# Altium footprint library PCB SMD.PcbLib: 79 footprints (part 5 of 5)
Each footprint in its own frame and in the unit in brackets; x right, y up, seen from the top. Pads: shape width x height; smd on the part's side, far side on the other; paste and mask are expansions set on the pad; w line width, h text height; cw(c..) or ccw(c..) is an arc to the next point about the centre after c.
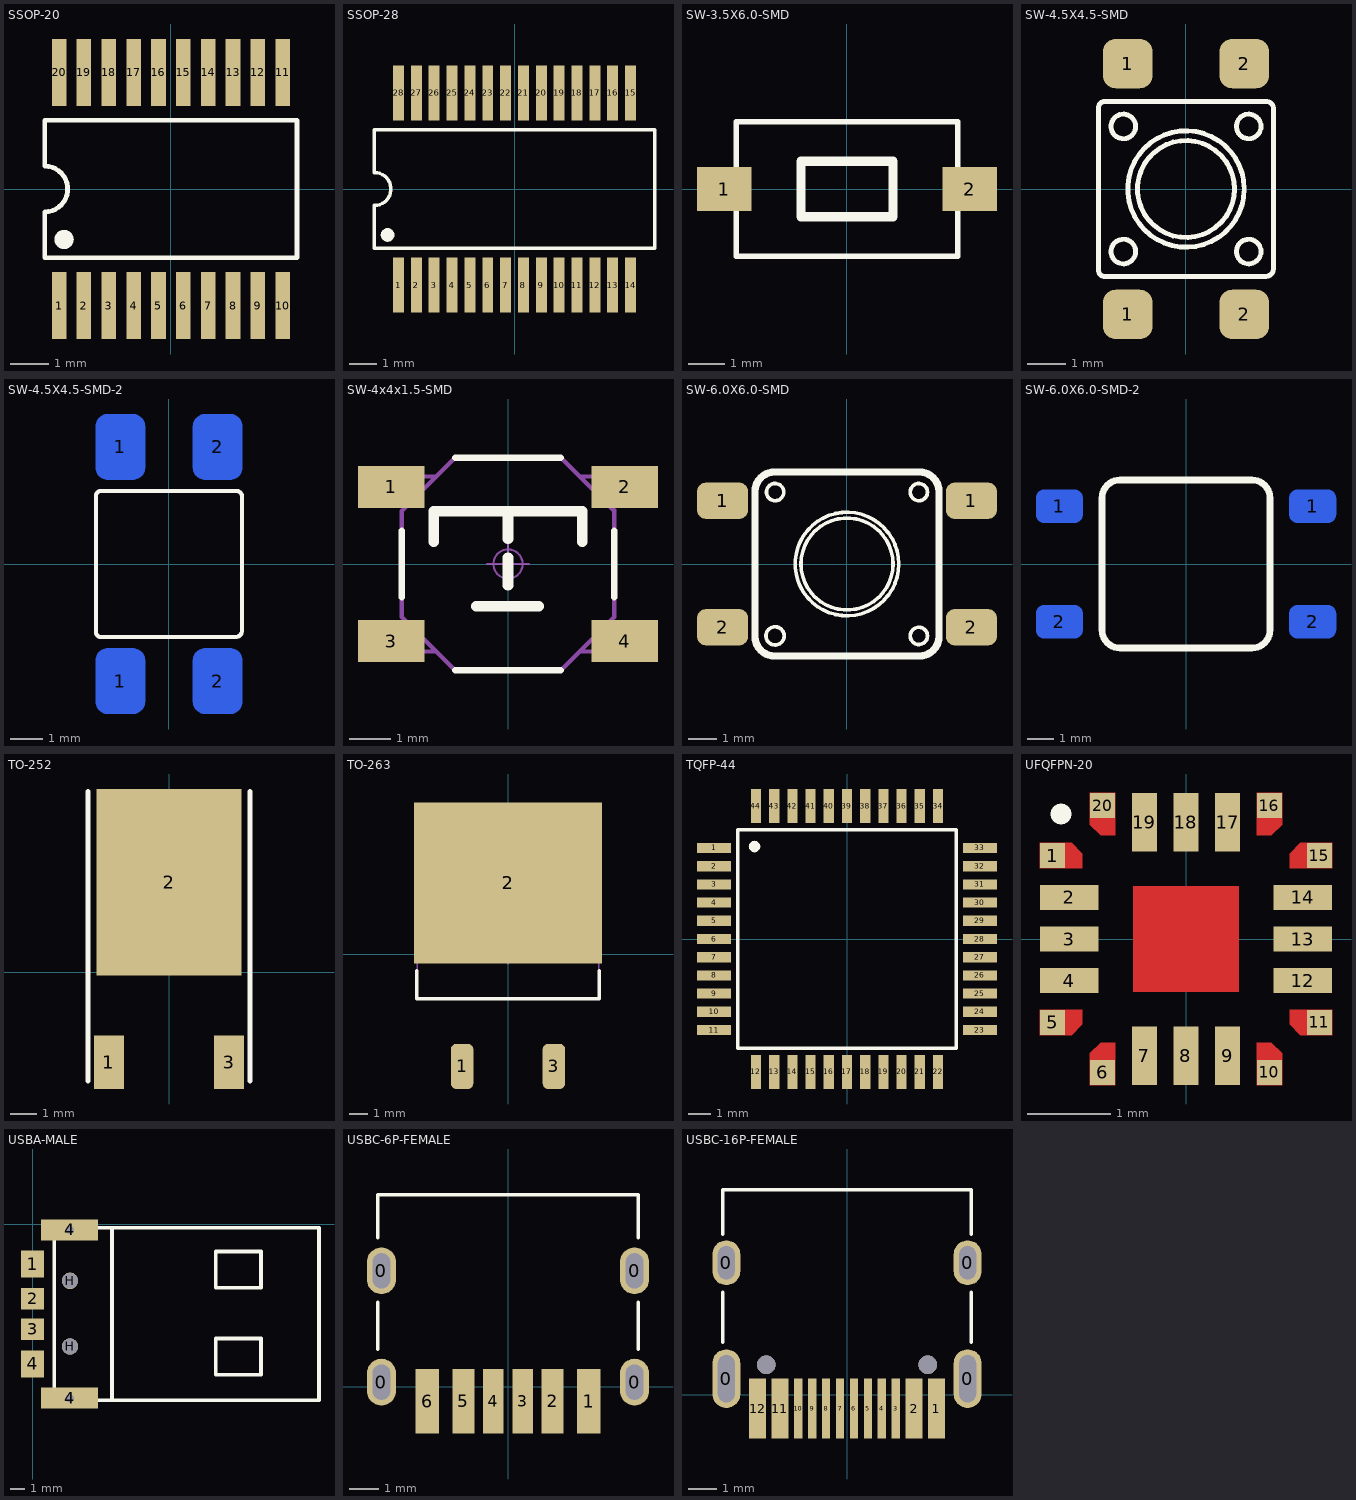
[diagram p4: the footprints below, top view; thin cyan lines are the x and y axes]

## SSOP-20 [mm]
pads (21):
  rect 0.381x1.75 smd: 1(-2.925,-3.05) 2(-2.275,-3.05) 3(-1.625,-3.05) 4(-0.975,-3.05) 5(-0.325,-3.05) 6(0.325,-3.05) 7(0.975,-3.05) 8(1.625,-3.05) 9(2.275,-3.05) 10(2.925,-3.05) 11(2.925,3.05) 12(2.275,3.05) 13(1.625,3.05) 14(0.975,3.05) 15(0.325,3.05) 16(-0.325,3.05) 17(-0.975,3.05) 18(-1.625,3.05) 19(-2.275,3.05) 20(-2.925,3.05)
  round 0.508 on Top Overlay: ""(-2.796,-1.321)
Top Overlay:
  lines w0.127: -3.3,-1.8 -3.3,-0.6 ccw(c-3.3,0) -3.3,0.6 -3.3,1.8 3.3,1.8 3.3,-1.8 -3.3,-1.8
3D body "SW3dPS-SSOP_20.STEP": height 1.79, standoff -0.05, extent -3.675,-3.95 3.625,3.95

## SSOP-28 [mm]
pads (29):
  rect 0.4x2 smd: 1(-4.225,-3.5) 2(-3.575,-3.5) 3(-2.925,-3.5) 4(-2.275,-3.5) 5(-1.625,-3.5) 6(-0.975,-3.5) 7(-0.325,-3.5) 8(0.325,-3.5) 9(0.975,-3.5) 10(1.625,-3.5) 11(2.275,-3.5) 12(2.925,-3.5) 13(3.575,-3.5) 14(4.225,-3.5) 15(4.225,3.5) 16(3.575,3.5) 17(2.925,3.5) 18(2.275,3.5) 19(1.625,3.5) 20(0.975,3.5) 21(0.325,3.5) 22(-0.325,3.5) 23(-0.975,3.5) 24(-1.625,3.5) 25(-2.275,3.5) 26(-2.925,3.5) 27(-3.575,3.5) 28(-4.225,3.5)
  round 0.508 on Top Overlay: ""(-4.622,-1.671)
Top Overlay:
  lines w0.127: -5.1,-2.159 -5.1,-0.6 ccw(c-5.1,0) -5.1,0.6 -5.1,2.159 5.1,2.159 5.1,-2.159 -5.1,-2.159
3D body "User Library-SSOP-28-1-1.STEP": height 2.15, standoff 0, extent -5.165,-3.929 5.165,3.827

## SW-3.5X6.0-SMD [mm]
pads (2):
  rect 1.5x1.2 smd: 1(-3.382,0) 2(3.382,0)
Top Overlay:
  lines w0.152: -3.05,-1.85 -3.05,1.85 3.05,1.85 3.05,-1.85 -3.05,-1.85
  lines w0.254: -1.27,-0.762 -1.27,0.762 1.27,0.762 1.27,-0.762 -1.27,-0.762
3D body "User Library-SWT-39.STEP": height 2.5, standoff 0, extent -4,-1.829 4,1.871

## SW-4.5X4.5-SMD [mm]
pads (4):
  rrect50% 1.27x1.27 smd: 1(-1.5,-3.229) 1(-1.5,3.229) 2(1.5,-3.229) 2(1.5,3.229)
Top Overlay:
  circle w0.127: c-1.615,-1.611 r0.316
  circle w0.127: c-1.615,1.611 r0.316
  circle w0.127: c1.615,-1.611 r0.316
  circle w0.127: c1.615,1.611 r0.316
  circle w0.127: c0,0 r1.25
  circle w0.127: c0,0 r1.5
  lines w0.127: -2.25,-2.108 ccw(c-2.108,-2.108) -2.108,-2.25 2.06,-2.25 ccw(c2.06,-2.06) 2.25,-2.06 2.25,2.083 ccw(c2.083,2.083) 2.083,2.25 -2.108,2.25 ccw(c-2.108,2.108) -2.25,2.108 -2.25,-2.108
3D body "SW4.5x4.5x5.STEP": height -0.39, standoff -5.49, extent -2.25,-3.4 2.25,3.4

## SW-4.5X4.5-SMD-2 [mil]
pads (4):
  rrect50% 60x80 smd far side: 1(-59.05,-142.12) 1(-59.05,142.12) 2(59.06,-142.12) 2(59.06,142.12)
Top Overlay:
  lines w5: -88.58,-83 ccw(c-83,-83) -83,-88.58 81.11,-88.58 ccw(c81.11,-81.1) 88.58,-81.1 88.58,82 ccw(c82,82) 82,88.59 -83,88.59 ccw(c-83,83) -88.58,83 -88.58,-83
3D body "SW4.5x4.5x5.STEP": height 7.87, standoff -192.91, extent -88.58,-133.86 88.58,133.86

## SW-4x4x1.5-SMD [mm]
height 1.5
pads (4):
  rect 1.6x1 smd: 1(-2.8,1.85) 2(2.8,1.85) 3(-2.8,-1.85) 4(2.8,-1.85)
Top Overlay:
  lines w0.152: -2.55,-0.8 -2.55,0.8 ; -1.27,-2.55 1.27,-2.55 ; -1.27,2.55 1.27,2.55 ; 2.55,-0.8 2.55,0.8
  lines w0.254: -1.778,0.533 -1.778,1.27 1.778,1.27 1.778,0.533 ; -0.762,-1.016 0.737,-1.016 ; 0,-0.508 0,0.152 ; 0,0.61 0,1.27
Mechanical 15:
  circle w0.05: c0,0 r0.35
  lines w0.05: -0.5,0 0.5,0 ; 0,-0.5 0,0.5
  lines w0.1: -2.221,-1.6 -3.2,-1.6 -3.2,-2.1 -1.719,-2.1 ; -2.221,1.6 -3.2,1.6 -3.2,2.1 -1.719,2.1 ; 1.719,-2.1 3.2,-2.1 3.2,-1.6 2.221,-1.6 ; 1.719,2.1 3.2,2.1 3.2,1.6 2.221,1.6 ; 2.55,1.27 1.27,2.55 -1.27,2.55 -2.55,1.27 -2.55,-1.27 -1.27,-2.55 1.27,-2.55 2.55,-1.27 2.55,1.295
3D body "ts44h.stp": height 1.5, standoff 0, extent -3.204,-2.6 3.196,2.6

## SW-6.0X6.0-SMD [mm]
pads (4):
  rrect50% 1.778x1.27 smd: 1(-4.327,2.2) 1(4.327,2.2) 2(-4.327,-2.2) 2(4.327,-2.2)
Top Overlay:
  circle w0.127: c-2.5,2.5 r0.3
  circle w0.127: c2.5,2.5 r0.3
  circle w0.127: c2.5,-2.5 r0.3
  circle w0.127: c-2.5,-2.5 r0.316
  circle w0.127: c0,0 r1.8
  circle w0.127: c0,0 r1.6
  lines w0.254: -3.2,-2.517 ccw(c-2.517,-2.517) -2.517,-3.2 2.517,-3.2 ccw(c2.517,-2.517) 3.2,-2.517 3.2,2.517 ccw(c2.517,2.517) 2.517,3.2 -2.517,3.2 ccw(c-2.517,2.517) -3.2,2.517 -3.2,-2.517
3D body "SW3dPS-switch.STEP": height 5, standoff 0, extent -4.5,-3 4.5,3

## SW-6.0X6.0-SMD-2 [mm]
pads (4):
  rrect50% 1.778x1.27 smd far side: 1(-4.827,2.2) 1(4.827,2.2) 2(-4.827,-2.2) 2(4.827,-2.2)
Top Overlay:
  lines w0.254: -3.2,-2.517 ccw(c-2.517,-2.517) -2.517,-3.2 2.517,-3.2 ccw(c2.517,-2.517) 3.2,-2.517 3.2,2.517 ccw(c2.517,2.517) 2.517,3.2 -2.517,3.2 ccw(c-2.517,2.517) -3.2,2.517 -3.2,-2.517
3D body "SW3dPS-switch.STEP": height 4.31, standoff -0.69, extent -4.5,-3 4.5,3

## TO-252 [mm]
pads (3):
  rect 1.143x2.032 smd: 1(-2.285,-3.425) 3(2.285,-3.425)
  rect 5.5x7.1 smd: 2(0,3.425)
Top Overlay:
  lines w0.203: -3.085,-4.125 -3.085,6.875 ; 3.085,-4.125 3.085,6.875
3D body "SW3dPS-DPAK-1.STEP": height 2.41, standoff 0, extent -3.27,-3.699 3.27,6.239

## TO-263 [mm]
pads (3):
  rrect50% 1.25x2.5 smd: 1(-2.54,-6.2) 3(2.54,-6.2)
  rect 10.4x8.9 smd: 2(0,3.95)
Top Overlay:
  lines w0.2: -5.05,-0.9 -5.05,-2.45 5.05,-2.45 5.05,-0.9
Mechanical 13:
  lines w0.1: -5.025,-2.45 5.025,-2.45 5.025,6.53 -5.025,6.53 -5.025,-2.45
Mechanical 15:
  lines w0.1: -0.5,0 0.5,0 ; 0,-0.5 0,0.5
3D body "SW3dPS-DPAK.STEP": height 4.92, standoff -0.09, extent -5.207,-7.454 4.953,7.81

## TQFP-44 [mm]
pads (45):
  rect 1.5x0.45 smd: 1(-5.842,4) 2(-5.842,3.2) 3(-5.842,2.4) 4(-5.842,1.6) 5(-5.842,0.8) 6(-5.842,0) 7(-5.842,-0.8) 8(-5.842,-1.6) 9(-5.842,-2.4) 10(-5.842,-3.2) 11(-5.842,-4) 23(5.842,-4) 24(5.842,-3.2) 25(5.842,-2.4) 26(5.842,-1.6) 27(5.842,-0.8) 28(5.842,0) 29(5.842,0.8) 30(5.842,1.6) 31(5.842,2.4) 32(5.842,3.2) 33(5.842,4)
  rect 0.45x1.5 smd: 12(-4,-5.842) 13(-3.2,-5.842) 14(-2.4,-5.842) 15(-1.6,-5.842) 16(-0.8,-5.842) 17(0,-5.842) 18(0.8,-5.842) 19(1.6,-5.842) 20(2.4,-5.842) 21(3.2,-5.842) 22(4,-5.842) 34(4,5.842) 35(3.2,5.842) 36(2.4,5.842) 37(1.6,5.842) 38(0.8,5.842) 39(0,5.842) 40(-0.8,5.842) 41(-1.6,5.842) 42(-2.4,5.842) 43(-3.2,5.842) 44(-4,5.842)
  round 0.508 on Top Overlay: ""(-4.064,4.064)
Top Overlay:
  lines w0.152: -4.801,-4.801 4.801,-4.801 4.801,4.801 -4.801,4.801 -4.801,-4.801
3D body "User Library-TQFP-44-1.STEP": height 1.1, standoff 0, extent -6,-6 6,6

## UFQFPN-20 [mm]
pads (21):
  rect 0.3x0.3 smd mask+0.05: 1(-1.6,1) 5(-1.6,-1) 6(-1,-1.6) 10(1,-1.6) 11(1.6,-1) 15(1.6,1) 16(1,1.6) 20(-1,1.6)
  rect 0.7x0.3 smd mask+0.05: 2(-1.4,0.5) 3(-1.4,0) 4(-1.4,-0.5) 12(1.4,-0.5) 13(1.4,0) 14(1.4,0.5)
  rect 0.3x0.7 smd mask+0.05: 7(-0.5,-1.4) 8(0,-1.4) 9(0.5,-1.4) 17(0.5,1.4) 18(0,1.4) 19(-0.5,1.4)
  round 0.254 on Top Overlay: ""(-1.5,1.5)
Top Layer:
  region: 1.152,1.373 1.025,1.246 0.848,1.246 0.848,1.754 1.152,1.754
  region: -1.152,-1.373 -1.025,-1.246 -0.848,-1.246 -0.848,-1.754 -1.152,-1.754
  region: 1.152,-1.373 1.025,-1.246 0.848,-1.246 0.848,-1.754 1.152,-1.754
  region: -1.373,-1.152 -1.246,-1.025 -1.246,-0.848 -1.754,-0.848 -1.754,-1.152
  region: -1.373,1.152 -1.246,1.025 -1.246,0.848 -1.754,0.848 -1.754,1.152
  region: -1.152,1.373 -1.025,1.246 -0.848,1.246 -0.848,1.754 -1.152,1.754
  region: 1.373,1.152 1.246,1.025 1.246,0.848 1.754,0.848 1.754,1.152
  region: 1.373,-1.152 1.246,-1.025 1.246,-0.848 1.754,-0.848 1.754,-1.152
  region: -0.635,0.635 0.635,0.635 0.635,-0.635 -0.635,-0.635
Top Solder:
  region: 1.198,1.343 1.046,1.19 0.801,1.19 0.801,1.8 1.198,1.8
  region: -1.198,-1.343 -1.046,-1.19 -0.801,-1.19 -0.801,-1.8 -1.198,-1.8
  region: 1.198,-1.343 1.046,-1.19 0.801,-1.19 0.801,-1.8 1.198,-1.8
  region: -1.343,-1.198 -1.19,-1.046 -1.19,-0.801 -1.8,-0.801 -1.8,-1.198
  region: -1.343,1.198 -1.19,1.046 -1.19,0.801 -1.8,0.801 -1.8,1.198
  region: -1.198,1.343 -1.046,1.19 -0.801,1.19 -0.801,1.8 -1.198,1.8
  region: 1.343,1.198 1.19,1.046 1.19,0.801 1.8,0.801 1.8,1.198
  region: 1.343,-1.198 1.19,-1.046 1.19,-0.801 1.8,-0.801 1.8,-1.198
  region: -0.686,0.686 0.686,0.686 0.686,-0.686 -0.686,-0.686
3D body "User Library-UFQFPN20-1.STEP": height 0.55, standoff 0, extent -1.5,-1.5 1.5,1.5

## USBA-MALE [mm]
pads (8):
  rect 1.6x1.9 smd: 1(0.002,-2.794) 4(0.002,-9.779)
  rect 1.6x1.5 smd: 2(0.002,-5.22) 3(0.002,-7.353)
  rect 4x1.5 hole 0.6 square: 4(2.6,-12.173) 4(2.6,-0.4)
  round 1.15 hole 1.1 unplated: H(2.625,-8.56) H(2.625,-3.962)
Top Overlay:
  lines w0.254: 5.563,-12.319 5.563,-0.254 ; 1.524,-12.319 1.524,-0.254 20.066,-0.254 20.066,-12.319 1.524,-12.319 ; 12.827,-10.541 16.002,-10.541 16.002,-8.001 12.827,-8.001 12.827,-10.541 ; 12.827,-4.445 16.002,-4.445 16.002,-1.905 12.827,-1.905 12.827,-4.445
3D body "14381.stp": height 3.17, standoff -2.63, extent 0.01,-12.573 20.31,0.033

## USBC-6P-FEMALE [mm]
pads (10):
  oval 1x1.6 hole 0.6 slot 1.2 at 90 deg: 0(-4.32,0.15) 0(-4.32,3.95) 0(4.32,0.15) 0(4.32,3.95)
  rect 0.8x2.2 smd: 1(2.75,-0.5) 6(-2.75,-0.5)
  rect 0.76x2.2 smd: 2(1.52,-0.5) 5(-1.52,-0.5)
  rect 0.7x2.2 smd: 3(0.5,-0.5) 4(-0.5,-0.5)
Top Overlay:
  lines w0.127: -4.447,1.27 -4.447,2.87 ; -4.447,5.08 -4.447,6.55 4.443,6.55 4.443,5.08 ; 4.443,1.27 4.443,2.87
3D body "User Library-USB_Type_C_6pin.STEP": height 3.26, standoff -0.96, extent -4.472,-0.224 4.468,6.576

## USBC-16P-FEMALE [mm]
pads (16):
  oval 1x2.1 hole 0.6 slot 1.7 at 90 deg: 0(-4.32,0.57) 0(4.32,0.57)
  oval 1x1.6 hole 0.6 slot 1.2 at 90 deg: 0(-4.32,4.72) 0(4.32,4.72)
  rect 0.6x2.14 smd: 1(3.2,-0.5) 2(2.4,-0.5) 11(-2.4,-0.5) 12(-3.2,-0.5)
  rect 0.3x2.14 smd: 3(1.75,-0.5) 4(1.25,-0.5) 5(0.75,-0.5) 6(0.25,-0.5) 7(-0.25,-0.5) 8(-0.75,-0.5) 9(-1.25,-0.5) 10(-1.75,-0.5)
via 2.89,1.07 diameter 0.65 hole 0.65
via -2.89,1.07 diameter 0.65 hole 0.65
Top Overlay:
  lines w0.127: -4.445,1.88 -4.445,3.658 ; -4.445,5.74 -4.445,7.341 4.445,7.341 ; 4.445,1.88 4.445,3.658 ; 4.445,5.74 4.445,7.315
3D body "User Library-USB-TYPE-C20.STEP": height 3.26, standoff -1.09, extent -4.47,-0.229 4.47,7.351